# Altium footprint library ICs And Semiconductors SMD.PcbLib: 943 footprints (part 49 of 60)
Each footprint in its own frame and in the unit in brackets; x right, y up, seen from the top. Pads: shape width x height; smd on the part's side, far side on the other; paste and mask are expansions set on the pad; w line width, h text height; cw(c..) or ccw(c..) is an arc to the next point about the centre after c.
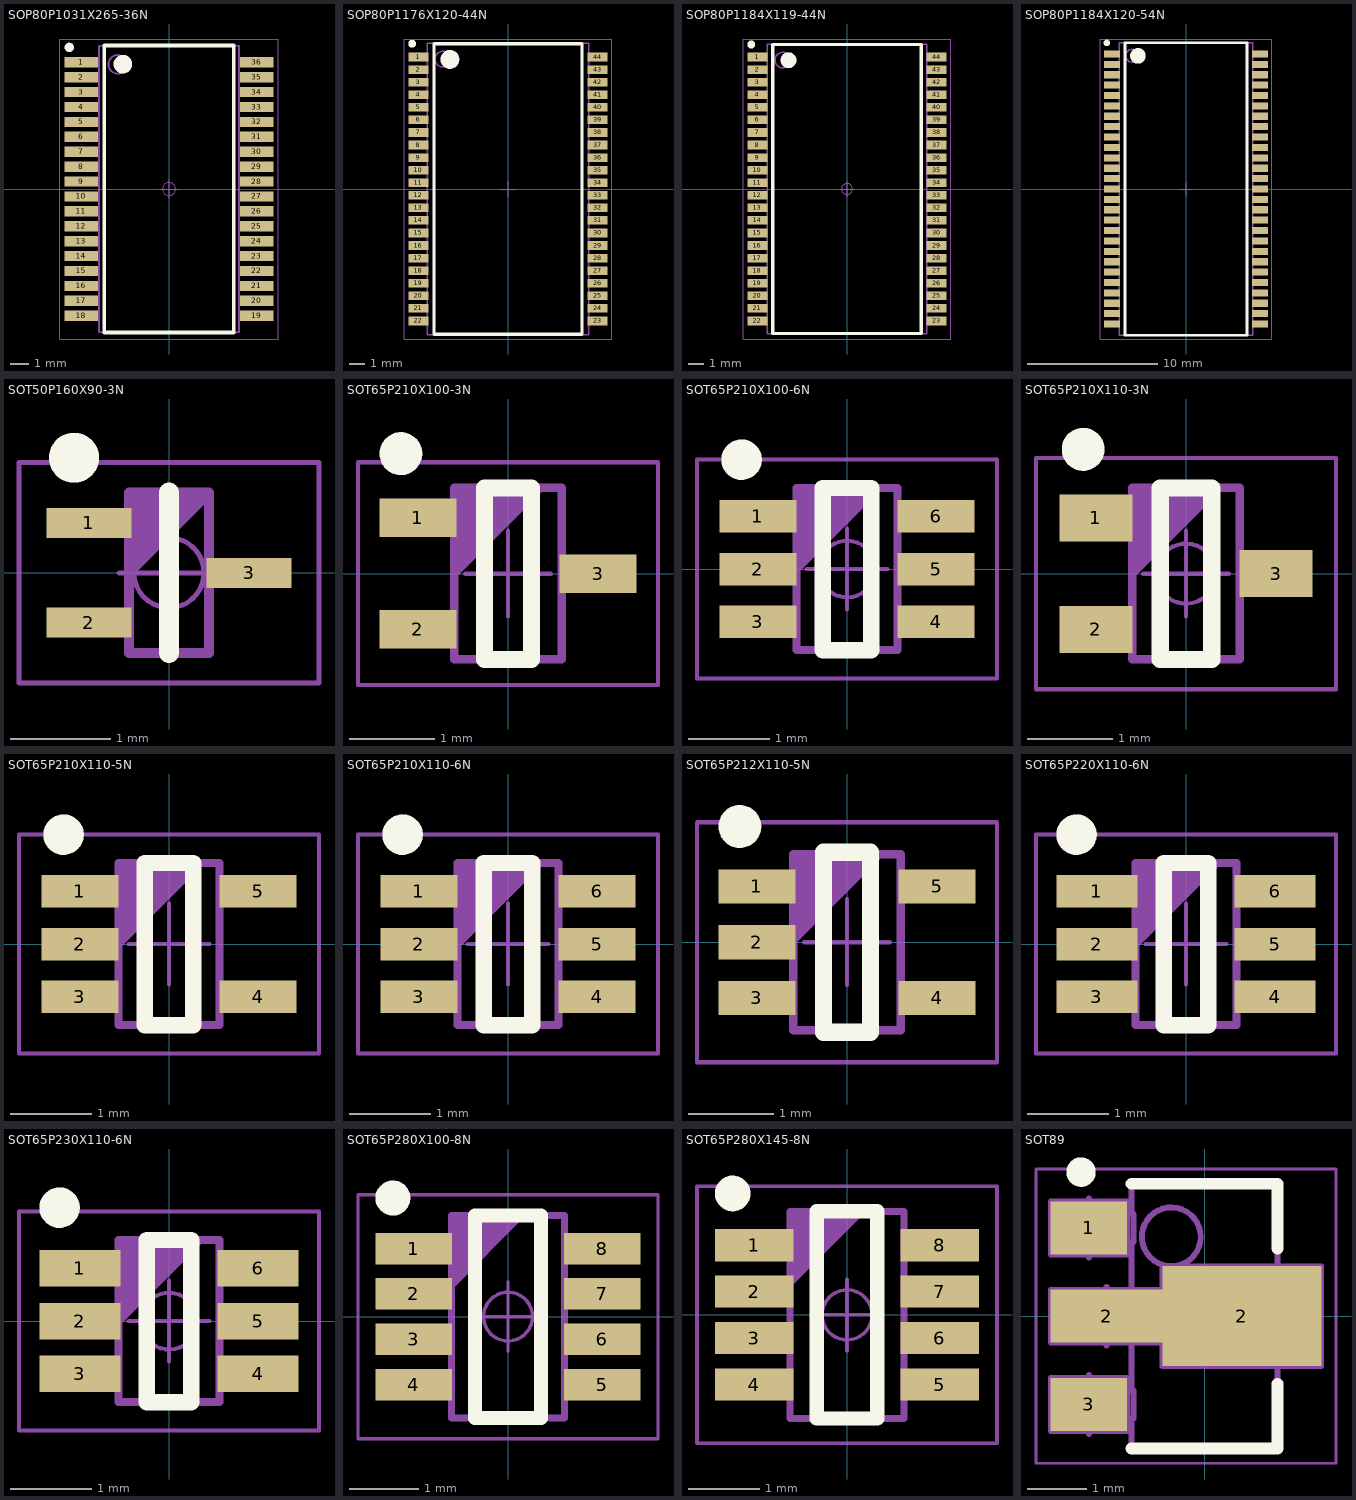
[diagram p48: the footprints below, top view; thin cyan lines are the x and y axes]

## SOP80P1031X265-36N [mm] "SOP, 0.80mm Pitch; 36 Pin, 7.50mm W X 15.375mm L X 2.65mm H Body, IPC Medium Density"
height 2.65
pads (36):
  rect 1.8x0.55 smd: 1(-4.7,6.8) 2(-4.7,6) 3(-4.7,5.2) 4(-4.7,4.4) 5(-4.7,3.6) 6(-4.7,2.8) 7(-4.7,2) 8(-4.7,1.2) 9(-4.7,0.4) 10(-4.7,-0.4) 11(-4.7,-1.2) 12(-4.7,-2) 13(-4.7,-2.8) 14(-4.7,-3.6) 15(-4.7,-4.4) 16(-4.7,-5.2) 17(-4.7,-6) 18(-4.7,-6.8) 19(4.7,-6.8) 20(4.7,-6) 21(4.7,-5.2) 22(4.7,-4.4) 23(4.7,-3.6) 24(4.7,-2.8) 25(4.7,-2) 26(4.7,-1.2) 27(4.7,-0.4) 28(4.7,0.4) 29(4.7,1.2) 30(4.7,2) 31(4.7,2.8) 32(4.7,3.6) 33(4.7,4.4) 34(4.7,5.2) 35(4.7,6) 36(4.7,6.8)
Top Overlay:
  circle w0.25: c-5.35,7.6 r0.125
  circle w0.5: c-2.475,6.7 r0.25
  lines w0.2: -3.475,-7.7 -3.475,7.7 3.475,7.7 3.475,-7.7 -3.475,-7.7
Mechanical 14:
  circle w0.1: c-2.75,6.688 r0.5
  lines w0.1: -3.75,-7.688 -3.75,7.688 3.75,7.688 3.75,-7.688 -3.75,-7.688
Mechanical 15:
  circle w0.05: c0,0 r0.35
  lines w0.05: -0.5,0 0.5,0 ; 0,-0.5 0,0.5 ; -5.85,-8.05 -5.85,8.05 5.85,8.05 5.85,-8.05 -5.85,-8.05
3D body "SOP80P1031X265-36N.stp": height 1.68, standoff 0, extent -5.155,-7.687 5.155,7.688

## SOP80P1176X120-44N [mm] "SOP,0.80mm pitch;44 pin,10.30mm W X 18.54mm L X 1.20mm H body, IPC Medium Density"
height 1.2
pads (44):
  rect 1.25x0.55 smd: 1(-5.7,8.4) 2(-5.7,7.6) 3(-5.7,6.8) 4(-5.7,6) 5(-5.7,5.2) 6(-5.7,4.4) 7(-5.7,3.6) 8(-5.7,2.8) 9(-5.7,2) 10(-5.7,1.2) 11(-5.7,0.4) 12(-5.7,-0.4) 13(-5.7,-1.2) 14(-5.7,-2) 15(-5.7,-2.8) 16(-5.7,-3.6) 17(-5.7,-4.4) 18(-5.7,-5.2) 19(-5.7,-6) 20(-5.7,-6.8) 21(-5.7,-7.6) 22(-5.7,-8.4) 23(5.7,-8.4) 24(5.7,-7.6) 25(5.7,-6.8) 26(5.7,-6) 27(5.7,-5.2) 28(5.7,-4.4) 29(5.7,-3.6) 30(5.7,-2.8) 31(5.7,-2) 32(5.7,-1.2) 33(5.7,-0.4) 34(5.7,0.4) 35(5.7,1.2) 36(5.7,2) 37(5.7,2.8) 38(5.7,3.6) 39(5.7,4.4) 40(5.7,5.2) 41(5.7,6) 42(5.7,6.8) 43(5.7,7.6) 44(5.7,8.4)
Top Overlay:
  circle w0.25: c-6.1,9.25 r0.125
  circle w0.6: c-3.7,8.25 r0.3
  lines w0.2: -4.7,-9.25 4.7,-9.25 4.7,9.25 -4.7,9.25 -4.7,-9.25
Mechanical 14:
  circle w0.1: c-4.15,8.27 r0.5
  lines w0.1: -5.15,-9.27 5.15,-9.27 5.15,9.27 -5.15,9.27 -5.15,-9.27
Mechanical 15:
  lines w0.05: -0.5,0 0.5,0 ; 0,-0.5 0,0.5 ; -6.6,-9.55 6.6,-9.55 6.6,9.55 -6.6,9.55 -6.6,-9.55
3D body "SOP80P1176X120-44N.stp": height 1.2, standoff 0, extent -5.98,-9.25 5.98,9.25

## SOP80P1184X119-44N [mm] "SOP, 0.80mm, Pitch; 44 pin, 10.16mm W X 18.415mm L X 1.194mm H body, IPC Medium Density"
height 1.19
pads (44):
  rect 1.3x0.55 smd: 1(-5.7,8.4) 2(-5.7,7.6) 3(-5.7,6.8) 4(-5.7,6) 5(-5.7,5.2) 6(-5.7,4.4) 7(-5.7,3.6) 8(-5.7,2.8) 9(-5.7,2) 10(-5.7,1.2) 11(-5.7,0.4) 12(-5.7,-0.4) 13(-5.7,-1.2) 14(-5.7,-2) 15(-5.7,-2.8) 16(-5.7,-3.6) 17(-5.7,-4.4) 18(-5.7,-5.2) 19(-5.7,-6) 20(-5.7,-6.8) 21(-5.7,-7.6) 22(-5.7,-8.4) 23(5.7,-8.4) 24(5.7,-7.6) 25(5.7,-6.8) 26(5.7,-6) 27(5.7,-5.2) 28(5.7,-4.4) 29(5.7,-3.6) 30(5.7,-2.8) 31(5.7,-2) 32(5.7,-1.2) 33(5.7,-0.4) 34(5.7,0.4) 35(5.7,1.2) 36(5.7,2) 37(5.7,2.8) 38(5.7,3.6) 39(5.7,4.4) 40(5.7,5.2) 41(5.7,6) 42(5.7,6.8) 43(5.7,7.6) 44(5.7,8.4)
Top Overlay:
  circle w0.5: c-3.725,8.2 r0.25
  circle w0.25: c-6.1,9.2 r0.125
  lines w0.2: -4.725,-9.2 4.725,-9.2 4.725,9.2 -4.725,9.2 -4.725,-9.2
Mechanical 14:
  circle w0.1: c-4.08,8.208 r0.5
  lines w0.1: -5.08,-9.208 5.08,-9.208 5.08,9.208 -5.08,9.208 -5.08,-9.208
Mechanical 15:
  circle w0.05: c0,0 r0.35
  lines w0.05: -0.5,0 0.5,0 ; 0,-0.5 0,0.5 ; -6.6,-9.55 6.6,-9.55 6.6,9.55 -6.6,9.55 -6.6,-9.55
3D body "SOP80P1184X119-44N.stp": height 1.2, standoff 0, extent -5.98,-9.25 5.98,9.25

## SOP80P1184X120-54N [mm] "SOP, 0.80mm Pitch; 54 Pin,10.26mm W X 22.52mm L X 1.20mm H body, IPC Medium Density"
height 1.2
pads (54):
  rect 1.25x0.55 smd: 1(-5.7,10.4) 2(-5.7,9.6) 3(-5.7,8.8) 4(-5.7,8) 5(-5.7,7.2) 6(-5.7,6.4) 7(-5.7,5.6) 8(-5.7,4.8) 9(-5.7,4) 10(-5.7,3.2) 11(-5.7,2.4) 12(-5.7,1.6) 13(-5.7,0.8) 14(-5.7,0) 15(-5.7,-0.8) 16(-5.7,-1.6) 17(-5.7,-2.4) 18(-5.7,-3.2) 19(-5.7,-4) 20(-5.7,-4.8) 21(-5.7,-5.6) 22(-5.7,-6.4) 23(-5.7,-7.2) 24(-5.7,-8) 25(-5.7,-8.8) 26(-5.7,-9.6) 27(-5.7,-10.4) 28(5.7,-10.4) 29(5.7,-9.6) 30(5.7,-8.8) 31(5.7,-8) 32(5.7,-7.2) 33(5.7,-6.4) 34(5.7,-5.6) 35(5.7,-4.8) 36(5.7,-4) 37(5.7,-3.2) 38(5.7,-2.4) 39(5.7,-1.6) 40(5.7,-0.8) 41(5.7,0) 42(5.7,0.8) 43(5.7,1.6) 44(5.7,2.4) 45(5.7,3.2) 46(5.7,4) 47(5.7,4.8) 48(5.7,5.6) 49(5.7,6.4) 50(5.7,7.2) 51(5.7,8) 52(5.7,8.8) 53(5.7,9.6) 54(5.7,10.4)
Top Overlay:
  circle w0.6: c-3.7,10.25 r0.3
  circle w0.25: c-6.1,11.25 r0.125
  lines w0.2: -4.7,-11.25 -4.7,11.25 4.7,11.25 4.7,-11.25 -4.7,-11.25
Mechanical 13:
  lines w0.05: -5.131,-11.259 5.131,-11.259
Mechanical 14:
  circle w0.1: c-4.131,10.259 r0.5
  lines w0.1: -5.131,-11.259 -5.131,11.259 5.131,11.259 5.131,-11.259 -5.131,-11.259
Mechanical 15:
  lines w0.05: -0.5,0 0.5,0 ; 0,-0.5 0,0.5 ; -6.6,-11.55 -6.6,11.55 6.6,11.55 6.6,-11.55 -6.6,-11.55
3D body "SOP80P1184X120-54N.stp": height 1.2, standoff 0, extent -5.97,-11.25 5.97,11.25

## SOT50P160X90-3N [mm] "SC-75/SOT-416, SOT, 0.50mm Pitch; 3 Pin,0.80mm W X 1.60mm L X 0.90mm H Body, IPC Medium Density"
height 1
pads (3):
  rect 0.85x0.3 smd: 1(-0.8,0.5) 2(-0.8,-0.5) 3(0.8,0)
Top Overlay:
  circle w0.25: c-0.95,1.15 r0.125
  lines w0.2: 0,-0.8 0,0.8
Mechanical 14:
  lines w0.1: -0.4,0 0.4,0.8 ; -0.4,0.1 0.3,0.8 ; -0.4,0.2 0.2,0.8 ; -0.4,0.3 0.1,0.8 ; -0.4,0.4 0,0.8 ; -0.4,0.5 -0.1,0.8 ; -0.4,0.6 -0.2,0.8 ; -0.4,0.7 -0.3,0.8 ; 0.4,0.8 -0.4,0.8 -0.4,-0.8 0.4,-0.8 0.4,0.8
Mechanical 15:
  circle w0.05: c0,0 r0.35
  lines w0.05: -0.5,0 0.5,0 ; 0,-0.5 0,0.5 ; -1.5,-1.1 -1.5,1.1 1.5,1.1 1.5,-1.1 -1.5,-1.1
3D body "SOT50P160X90-3N.stp": height 0.9, standoff 0, extent -0.85,-0.8 0.85,0.8

## SOT65P210X100-3N [mm] "SOT323, 0.65mm pitch; 3 pin, 1.25mm W X 2.00mm L, IPC Medium Density"
height 1
pads (3):
  rect 0.9x0.45 smd: 1(-1.05,0.65) 2(-1.05,-0.65) 3(1.05,0)
Top Overlay:
  circle w0.25: c-1.25,1.4 r0.125
  lines w0.2: -0.275,-1 -0.275,1 0.275,1 0.275,-1 -0.275,-1
Mechanical 14:
  lines w0.1: -0.625,0 0.375,1 ; -0.625,0.1 0.275,1 ; -0.625,0.2 0.175,1 ; -0.625,0.3 0.075,1 ; -0.625,0.4 -0.025,1 ; -0.625,0.5 -0.125,1 ; -0.625,0.6 -0.225,1 ; -0.625,0.7 -0.325,1 ; -0.625,0.8 -0.425,1 ; -0.625,0.9 -0.525,1 ; -0.625,-1 0.625,-1 0.625,1 -0.625,1 -0.625,-1
Mechanical 15:
  lines w0.05: -0.5,0 0.5,0 ; 0,-0.5 0,0.5 ; -1.75,-1.3 1.75,-1.3 1.75,1.3 -1.75,1.3 -1.75,-1.3
3D body "SOT65P210X100-3N.stp": height 1, standoff 0, extent -1.1,-1.1 1.1,1.1

## SOT65P210X100-6N [mm] "SOT363, SC70-6, SOT, 0.65mm Pitch, 6 pin, 1.25mm W X 2.00mm L X 1.00mm H, IPC Medium Density"
height 1
pads (6):
  rect 0.95x0.4 smd: 1(-1.1,0.65) 2(-1.1,0) 3(-1.1,-0.65) 4(1.1,-0.65) 5(1.1,0) 6(1.1,0.65)
Top Overlay:
  circle w0.25: c-1.3,1.35 r0.125
  lines w0.2: -0.3,-1 -0.3,1 0.3,1 0.3,-1 -0.3,-1
Mechanical 14:
  lines w0.1: -0.625,0 0.375,1 ; -0.625,0.1 0.275,1 ; -0.625,0.2 0.175,1 ; -0.625,0.3 0.075,1 ; -0.625,0.4 -0.025,1 ; -0.625,0.5 -0.125,1 ; -0.625,0.6 -0.225,1 ; -0.625,0.7 -0.325,1 ; -0.625,0.8 -0.425,1 ; -0.625,0.9 -0.525,1 ; -0.625,-1 -0.625,1 0.625,1 0.625,-1 -0.625,-1
Mechanical 15:
  circle w0.05: c0,0 r0.35
  lines w0.05: -0.5,0 0.5,0 ; 0,-0.5 0,0.5 ; -1.85,-1.35 -1.85,1.35 1.85,1.35 1.85,-1.35 -1.85,-1.35
3D body "SOT65P210X100-6N.stp": height 1, standoff 0, extent -1.2,-1.1 1.2,1.1

## SOT65P210X110-3N [mm] "SOT323, 0.65mm pitch; 3 pin, 1.25mm W X 2.00mm L, IPC Medium Density"
height 1.1
pads (3):
  rect 0.85x0.55 smd: 1(-1.05,0.65) 2(-1.05,-0.65) 3(1.05,0)
Top Overlay:
  circle w0.25: c-1.2,1.45 r0.125
  lines w0.2: -0.3,-1 0.3,-1 0.3,1 -0.3,1 -0.3,-1
Mechanical 14:
  lines w0.1: -0.625,0 0.375,1 ; -0.625,0.1 0.275,1 ; -0.625,0.2 0.175,1 ; -0.625,0.3 0.075,1 ; -0.625,0.4 -0.025,1 ; -0.625,0.5 -0.125,1 ; -0.625,0.6 -0.225,1 ; -0.625,0.7 -0.325,1 ; -0.625,0.8 -0.425,1 ; -0.625,0.9 -0.525,1 ; -0.625,-1 0.625,-1 0.625,1 -0.625,1 -0.625,-1
Mechanical 15:
  circle w0.05: c0,0 r0.35
  lines w0.05: -0.5,0 0.5,0 ; 0,-0.5 0,0.5 ; -1.75,-1.35 1.75,-1.35 1.75,1.35 -1.75,1.35 -1.75,-1.35
3D body "SOT65P210X110-3N.stp": height 1.1, standoff 0, extent -1.1,-1.1 1.1,1.1

## SOT65P210X110-5N [mm] "SOT353, SC70-5, SOT, 0.65mm Pitch, 5 pin, 1.25mm W X 2.00mm L X 1.10mm H, IPC Medium Density"
height 1.1
pads (5):
  rect 0.95x0.4 smd: 1(-1.1,0.65) 2(-1.1,0) 3(-1.1,-0.65) 4(1.1,-0.65) 5(1.1,0.65)
Top Overlay:
  circle w0.25: c-1.3,1.35 r0.125
  lines w0.2: -0.3,-1 -0.3,1 0.3,1 0.3,-1 -0.3,-1
Mechanical 14:
  lines w0.1: -0.625,0 0.375,1 ; -0.625,0.1 0.275,1 ; -0.625,0.2 0.175,1 ; -0.625,0.3 0.075,1 ; -0.625,0.4 -0.025,1 ; -0.625,0.5 -0.125,1 ; -0.625,0.6 -0.225,1 ; -0.625,0.7 -0.325,1 ; -0.625,0.8 -0.425,1 ; -0.625,0.9 -0.525,1 ; -0.625,-1 -0.625,1 0.625,1 0.625,-1 -0.625,-1
Mechanical 15:
  lines w0.05: -0.5,0 0.5,0 ; 0,-0.5 0,0.5 ; -1.85,-1.35 -1.85,1.35 1.85,1.35 1.85,-1.35 -1.85,-1.35
3D body "SOT65P210X110-5N.stp": height 1.1, standoff 0, extent -1.2,-1.1 1.2,1.1

## SOT65P210X110-6N [mm] "SOT363, SC70-6, SOT, 0.65mm Pitch, 6 pin, 1.25mm W X 2.00mm L X 1.10mm H, IPC Medium Density"
height 1.1
pads (6):
  rect 0.95x0.4 smd: 1(-1.1,0.65) 2(-1.1,0) 3(-1.1,-0.65) 4(1.1,-0.65) 5(1.1,0) 6(1.1,0.65)
Top Overlay:
  circle w0.25: c-1.3,1.35 r0.125
  lines w0.2: -0.3,-1 0.3,-1 0.3,1 -0.3,1 -0.3,-1
Mechanical 14:
  lines w0.1: -0.625,0 0.375,1 ; -0.625,0.1 0.275,1 ; -0.625,0.2 0.175,1 ; -0.625,0.3 0.075,1 ; -0.625,0.4 -0.025,1 ; -0.625,0.5 -0.125,1 ; -0.625,0.6 -0.225,1 ; -0.625,0.7 -0.325,1 ; -0.625,0.8 -0.425,1 ; -0.625,0.9 -0.525,1 ; -0.625,-1 0.625,-1 0.625,1 -0.625,1 -0.625,-1
Mechanical 15:
  lines w0.05: -0.5,0 0.5,0 ; 0,-0.5 0,0.5 ; -1.85,-1.35 1.85,-1.35 1.85,1.35 -1.85,1.35 -1.85,-1.35
3D body "SOT65P210X110-6N.stp": height 1.1, standoff 0, extent -1.2,-1.1 1.2,1.1

## SOT65P212X110-5N [mm] "SOT353, SOT, 0.65mm Pitch, 5 pin, 1.25mm W X 2.05mm L X 1.10mm H, IPC Medium Density"
height 1.1
pads (5):
  rect 0.9x0.4 smd: 1(-1.05,0.65) 2(-1.05,0) 3(-1.05,-0.65) 4(1.05,-0.65) 5(1.05,0.65)
Top Overlay:
  circle w0.25: c-1.25,1.35 r0.125
  lines w0.2: -0.275,-1.05 -0.275,1.05 0.275,1.05 0.275,-1.05 -0.275,-1.05
Mechanical 14:
  lines w0.1: -0.625,0.025 0.375,1.025 ; -0.625,0.125 0.275,1.025 ; -0.625,0.225 0.175,1.025 ; -0.625,0.325 0.075,1.025 ; -0.625,0.425 -0.025,1.025 ; -0.625,0.525 -0.125,1.025 ; -0.625,0.625 -0.225,1.025 ; -0.625,0.725 -0.325,1.025 ; -0.625,0.825 -0.425,1.025 ; -0.625,0.925 -0.525,1.025 ; -0.625,-1.025 -0.625,1.025 0.625,1.025 0.625,-1.025 -0.625,-1.025
Mechanical 15:
  lines w0.05: -0.5,0 0.5,0 ; 0,-0.5 0,0.5 ; -1.75,-1.4 -1.75,1.4 1.75,1.4 1.75,-1.4 -1.75,-1.4
3D body "SOT65P212X110-5N.stp": height 1.1, standoff 0, extent -1.2,-1.1 1.2,1.1

## SOT65P220X110-6N [mm] "SOT363, 0.65mm pitch; 6 pin, 1.25mm W X 2mm L, IPC Medium Density"
height 1.1
pads (6):
  rect 1x0.4 smd: 1(-1.1,0.65) 2(-1.1,0) 3(-1.1,-0.65) 4(1.1,-0.65) 5(1.1,0) 6(1.1,0.65)
Top Overlay:
  circle w0.25: c-1.35,1.35 r0.125
  lines w0.2: -0.275,-1 -0.275,1 0.275,1 0.275,-1 -0.275,-1
Mechanical 14:
  lines w0.1: -0.625,0 0.375,1 ; -0.625,0.1 0.275,1 ; -0.625,0.2 0.175,1 ; -0.625,0.3 0.075,1 ; -0.625,0.4 -0.025,1 ; -0.625,0.5 -0.125,1 ; -0.625,0.6 -0.225,1 ; -0.625,0.7 -0.325,1 ; -0.625,0.8 -0.425,1 ; -0.625,0.9 -0.525,1 ; -0.625,-1 -0.625,1 0.625,1 0.625,-1 -0.625,-1
Mechanical 15:
  lines w0.05: -0.5,0 0.5,0 ; 0,-0.5 0,0.5 ; -1.85,-1.35 -1.85,1.35 1.85,1.35 1.85,-1.35 -1.85,-1.35
3D body "SOT65P220X110-6N.stp": height 1.1, standoff 0, extent -1.2,-1.1 1.2,1.1

## SOT65P230X110-6N [mm] "SOT363, SOT, 0.65mm Pitch; 6 Pin, 1.25mm W X 2.00mm L X 1.10mm H body, IPC Medium Density"
height 1.1
pads (6):
  rect 1x0.45 smd: 1(-1.1,0.65) 2(-1.1,0) 3(-1.1,-0.65) 4(1.1,-0.65) 5(1.1,0) 6(1.1,0.65)
Top Overlay:
  circle w0.25: c-1.35,1.4 r0.125
  lines w0.2: -0.275,-1 -0.275,1 0.275,1 0.275,-1 -0.275,-1
Mechanical 14:
  lines w0.1: -0.625,0 0.375,1 ; -0.625,0.1 0.275,1 ; -0.625,0.2 0.175,1 ; -0.625,0.3 0.075,1 ; -0.625,0.4 -0.025,1 ; -0.625,0.5 -0.125,1 ; -0.625,0.6 -0.225,1 ; -0.625,0.7 -0.325,1 ; -0.625,0.8 -0.425,1 ; -0.625,0.9 -0.525,1 ; -0.625,-1 -0.625,1 0.625,1 0.625,-1 -0.625,-1
Mechanical 15:
  circle w0.05: c0,0 r0.35
  lines w0.05: -0.5,0 0.5,0 ; 0,-0.5 0,0.5 ; -1.85,-1.35 -1.85,1.35 1.85,1.35 1.85,-1.35 -1.85,-1.35
3D body "SOT65P230X110-6N.stp": height 1.1, standoff 0, extent -1.15,-1.1 1.15,1.1

## SOT65P280X100-8N [mm] "SOT, 0.65mm pitch; 8 pin, 1.625mm W X 2.90mm L X 1.00mm H body, IPC Medium Density"
height 1
pads (8):
  rect 1.1x0.45 smd: 1(-1.35,0.975) 2(-1.35,0.325) 3(-1.35,-0.325) 4(-1.35,-0.975) 5(1.35,-0.975) 6(1.35,-0.325) 7(1.35,0.325) 8(1.35,0.975)
Top Overlay:
  circle w0.25: c-1.65,1.7 r0.125
  lines w0.2: -0.475,-1.45 -0.475,1.45 0.475,1.45 0.475,-1.45 -0.475,-1.45
Mechanical 14:
  lines w0.1: -0.812,0.45 0.188,1.45 ; -0.812,0.55 0.088,1.45 ; -0.812,0.65 -0.012,1.45 ; -0.812,0.75 -0.112,1.45 ; -0.812,0.85 -0.212,1.45 ; -0.812,0.95 -0.312,1.45 ; -0.812,1.05 -0.412,1.45 ; -0.812,1.15 -0.512,1.45 ; -0.812,1.25 -0.612,1.45 ; -0.812,1.35 -0.712,1.45 ; -0.812,-1.45 -0.812,1.45 0.812,1.45 0.812,-1.45 -0.812,-1.45
Mechanical 15:
  circle w0.05: c0,0 r0.35
  lines w0.05: -0.5,0 0.5,0 ; 0,-0.5 0,0.5 ; -2.15,-1.75 -2.15,1.75 2.15,1.75 2.15,-1.75 -2.15,-1.75
3D body "SOT65P280X100-8N.stp": height 1, standoff 0, extent -1.4,-1.5 1.4,1.5

## SOT65P280X145-8N [mm] "SOT, 0.65mm pitch; 8 pin, 1.625mm W X 2.90mm L X 1.45mm H body, IPC Medium Density"
height 1.45
pads (8):
  rect 1.1x0.45 smd: 1(-1.3,0.975) 2(-1.3,0.325) 3(-1.3,-0.325) 4(-1.3,-0.975) 5(1.3,-0.975) 6(1.3,-0.325) 7(1.3,0.325) 8(1.3,0.975)
Top Overlay:
  circle w0.25: c-1.6,1.7 r0.125
  lines w0.2: -0.425,-1.45 0.425,-1.45 0.425,1.45 -0.425,1.45 -0.425,-1.45
Mechanical 14:
  lines w0.1: -0.8,0.45 0.2,1.45 ; -0.8,0.55 0.1,1.45 ; -0.8,0.65 0,1.45 ; -0.8,0.75 -0.1,1.45 ; -0.8,0.85 -0.2,1.45 ; -0.8,0.95 -0.3,1.45 ; -0.8,1.05 -0.4,1.45 ; -0.8,1.15 -0.5,1.45 ; -0.8,1.25 -0.6,1.45 ; -0.8,1.35 -0.7,1.45 ; -0.8,-1.45 0.8,-1.45 0.8,1.45 -0.8,1.45 -0.8,-1.45
Mechanical 15:
  circle w0.05: c0,0 r0.35
  lines w0.05: -0.5,0 0.5,0 ; 0,-0.5 0,0.5 ; -2.1,-1.8 2.1,-1.8 2.1,1.8 -2.1,1.8 -2.1,-1.8
3D body "SOT65P280X145-8N.stp": height 1.2, standoff 0, extent -1.513,-1.45 1.513,1.45

## SOT89 [mm] "SOT89-3, 3-Leads, Body 2.48x4.5mm"
height 1.6
pads (4):
  rect 1.3x0.9 smd: 1(-1.965,1.5) 3(-1.965,-1.5)
  rect 1.9x0.9 smd: 2(-1.665,0)
  rect 2.7x1.7 smd: 2(0.635,0)
Top Overlay:
  circle w0.25: c-2.1,2.45 r0.125
  lines w0.2: -1.24,-2.25 1.24,-2.25 1.24,-1.15 ; -1.24,2.25 1.24,2.25 1.24,1.15
Mechanical 8:
  lines w0.1: -2.465,-1.5 -1.965,-1.5 ; -2.465,1.5 -1.965,1.5 ; -2.165,0 -1.665,0 ; -1.965,-2 -1.965,-1.5 ; -1.965,-1 -1.965,-1.5 ; -1.965,1 -1.965,1.5 ; -1.965,2 -1.965,1.5 ; -1.665,-0.5 -1.665,0 ; -1.665,0.5 -1.665,0 ; -1.465,-1.5 -1.965,-1.5 ; -1.465,1.5 -1.965,1.5 ; -1.165,0 -1.665,0 ; -0.5,0 0,0 ; 0,-0.5 0,0 ; 0,0.5 0,0 ; 0.635,-0.5 0.635,0 ; 0.635,0.5 0.635,0 ; 1.135,0 0.635,0 ; -2.615,-1.95 -1.315,-1.95 -1.315,-1.05 -2.615,-1.05 -2.615,-1.95 ; -2.615,-0.45 -2.615,0.45 -0.715,0.45 -0.715,0.85 1.985,0.85 1.985,-0.85 -0.715,-0.85 -0.715,-0.45 -2.615,-0.45 ; -2.615,1.05 -1.315,1.05 -1.315,1.95 -2.615,1.95 -2.615,1.05
Mechanical 14:
  circle w0.1: c-0.565,1.35 r0.5
  lines w0.1: -1.24,-1.74 -1.24,-2.25 1.24,-2.25 1.24,-0.8 ; -1.24,-1.26 -1.24,-0.24 ; -1.24,0.24 -1.24,1.26 ; -1.24,1.74 -1.24,2.25 1.24,2.25 1.24,0.8 ; -2.44,-1.74 -2.44,-1.26 -1.206,-1.26 -1.206,-1.74 -2.44,-1.74 ; -2.44,-0.24 -2.44,0.24 -1.206,0.24 -1.206,-0.24 -2.44,-0.24 ; -2.44,1.26 -2.44,1.74 -1.206,1.74 -1.206,1.26 -2.44,1.26 ; 1.206,-0.8 1.206,0.8 1.61,0.8 cw(c1.61,0.6) 1.81,0.6 1.81,-0.6 cw(c1.61,-0.6) 1.61,-0.8 1.206,-0.8
Mechanical 15:
  lines w0.05: -2.865,-2.5 2.235,-2.5 2.235,2.5 -2.865,2.5 -2.865,-2.5
3D body "SOT89.stp": height 1.6, standoff 0, extent -2.44,-2.25 1.81,2.25